# Altium integrated library Mastermind Devices.IntLib: 910 symbols (part 3 of 6) (continued)
## MCP23017SP
designator IC?, comment http://ww1.microchip.com/downloads/en/DeviceDoc/21952a.pdf   Source: http://ww1.microchip.com/downloads/en/DeviceDoc/21952a.pdf
footprint DIL28-3
pins: 1 GPB0, 2 GPB1, 3 GPB2, 4 GPB3, 5 GPB4, 6 GPB5, 7 GPB6, 8 GPB7, 9 VDD (power), 10 VSS (power), 12 SCL, 13 SDA, 15 A0, 16 A1, 17 A2, 18 !RESET, 19 INTB (out), 20 INTA (out), 21 GPA0, 22 GPA1, 23 GPA2, 24 GPA3, 25 GPA4, 26 GPA5, 27 GPA6, 28 GPA7

## MCP23017SP2
designator IC?, comment http://ww1.microchip.com/downloads/en/DeviceDoc/21952a.pdf   Source: http://ww1.microchip.com/downloads/en/DeviceDoc/21952a.pdf
footprint DIL28-3-ROUND
pins: 1 GPB0, 2 GPB1, 3 GPB2, 4 GPB3, 5 GPB4, 6 GPB5, 7 GPB6, 8 GPB7, 9 VDD (power), 10 VSS (power), 12 SCL, 13 SDA, 15 A0, 16 A1, 17 A2, 18 !RESET, 19 INTB (out), 20 INTA (out), 21 GPA0, 22 GPA1, 23 GPA2, 24 GPA3, 25 GPA4, 26 GPA5, 27 GPA6, 28 GPA7

## MCP23017SS
designator IC?, comment http://ww1.microchip.com/downloads/en/DeviceDoc/21952a.pdf   Source: http://ww1.microchip.com/downloads/en/DeviceDoc/21952a.pdf
footprint SSOP28
pins: 1 GPB0, 2 GPB1, 3 GPB2, 4 GPB3, 5 GPB4, 6 GPB5, 7 GPB6, 8 GPB7, 9 VDD (power), 10 VSS (power), 12 SCL, 13 SDA, 15 A0, 16 A1, 17 A2, 18 !RESET, 19 INTB (out), 20 INTA (out), 21 GPA0, 22 GPA1, 23 GPA2, 24 GPA3, 25 GPA4, 26 GPA5, 27 GPA6, 28 GPA7

## MCP73811/2
designator IC?, comment MCP73811 and MCP73812   Simple, Miniature Single-Cell, Fully Integrated Li-Ion / Li-Polymer Charge Management Controllers  SOT-23-5 package, no indicator LED but with adjustable current, small and very inexpensive  (value not drawn)
footprint SOT23-5L
pins: 1 CE, 2 VSS (power), 3 VBAT, 4 VDD (power), 5 PROG

## MCP73831/OT
designator IC?, comment MCP73831/2   Miniature Single-Cell, Fully Integrated Li-Ion, Li-Polymer Charge Management Controllers.    Nice and small simple lipoly charge controller, with adjustable current and status output (LED)    http://www.ladyada.net/library/pcb/eaglelibrary.html  (value not drawn)
footprint SOT23-5L
pins: 1 STAT (out), 2 VSS (power), 3 VBAT, 4 VDD (power), 5 PROG

## MCP73833-UN
designator IC?
footprint MSOP10
pins: 1 VDD1 (power), 2 VDD2 (power), 3 STAT1, 4 STAT2, 5 GND (power), 6 PROG, 7 /PG, 8 THERM, 9 VBAT1 (out), 10 VBAT2 (out)

## MCP73871
designator IC?
footprint QFN20
pins: 1 OUT1 (out), 2 VPCC, 3 SEL, 4 PROG2, 5 THERM, 6 /PG (out), 7 STAT2 (out), 8 STAT1/LBO (out), 9 /TE, 10 GND1 (power), 11 GND2 (power), 12 PROG3, 13 PROG1, 14 VBAT1 (out), 15 VBAT2 (out), 16 VBAT3 (out), 17 CE, 18 IN1, 19 IN2, 20 OUT2 (out)

## MCR100
designator Q?
Silicon Controlled Rectifier; Published: 8-Jun-2000; LatestRevisionDate: 17-Jul-2002; LatestRevisionNote: Re-released for DXP Platform.; PackageReference: TO-220-AB; Publisher: Altium Limited; Code_JEDEC: TO-220-AB
simulation model SCR (Spice Subcircuit)
footprint SOT23
pins: 1 K, 2 G, 3 A

## ME2187AN20BG
designator U?
-40℃~+85℃@(TA) 1 10A 2.7V~12V 4.5V~12.6V 550kHz 600uA Adjustable Boost Boost Built-in Yes DFN-20L(3.5x4.5) DC-DC Converters ROHS; Manufacturer: MICRONE(南京微盟); Contributor: LCSC; Supplier: LCSC; Supplier Part: C610274; Manufacturer Part: ME2187AN20BG; JLCPCB Part Class: Extended Part; spicePre: U; spiceSymbolName: ME2187AN20BG
footprint VQFN-20_L4.5-W3.5-P0.50-BL-EP_BQ24100RHLR; pin to pad 4>4+5+6+7 14>14+15+16
footprint Model Name (Footprint not found); pin to pad 4>4+5+6+7
pins: 1 VCC, 2 EN, 3 FSW, 4 SW, 8 BOOT, 9 VIN, 10 SS, 13 MODE, 14 VOUT, 17 FB, 18 COMP, 19 ILIM, 20 AGND, 21,11,12 PAD
text: 21

## ME3116
designator U?
Step-down type 1A 4.75V~40V SOT-23-6 DC-DC Converters ROHS
footprint SOT23-6
pins: 1 BS (power), 2 GND, 3 FB, 4 EN (power), 5 IN, 6 SW

## MIC2101YML-TR
designator U?
DC-DC Converters MLF-16; Manufacturer: MICROCHIP(美国微芯); Contributor: lcsc; Supplier: LCSC; Supplier Part: C621528; Manufacturer Part: MIC2101YML-TR; spicePre: U; spiceSymbolName: MIC2101YML-TR
footprint VQFN-16_L3.0-W3.0-P0.50-BL-EP1.7
pins: 1 VDD, 2 PVDD, 3 ILIM, 4 DL, 5 PGND, 6 FREQ, 7 DH, 8 SW, 9 GND hidden to GND, 10 BST, 11 GND hidden to GND, 12 AGND, 13 FB, 14 PG, 15 EN, 16 VIN, 17 GND hidden to GND

## MICRO-USB-LONG
designator J?
GateName_1: G$1; SymbolName_1: MICRO-USB-LONG; LibraryName: microusb; DeviceSetName: MICRO-USB-LONG; Package: MICRO_USB_LONG
footprint MICRO_USB_LONG
pins: 1 VCC (power), 2 GND (power)
text: USB

## MICROSD
designator ?, comment Micro-SD / Transflash card holder with SPI pinout   For the 3M # 2908-05WB-MG and/or 4UCON #19656 push-push type  (value not drawn)
GateName_1: G$1; DeviceSetName: MICROSD; SymbolName_1: TRANSFLASH; LibraryName: micro-sd; Package: C12075
footprint C12075
pins: 1 DAT2/RSV (io), 2 CD/DAT3/CS (io), 3 CMD/DI (io), 4 VDD (power), 5 CLK/SCLK (io), 6 GND (power), 7 DAT0/DO (io), 8 DAT1/RSV (io), CD (io), GND@1 SHIELD@1 (power), GND@2 SHIELD@2 (power), GND@3 SHIELD@3 (power), GND@4 SHIELD@4 (power)

## MICROSD_1
designator ?, comment Micro-SD / Transflash card holder with SPI pinout   For the 3M # 2908-05WB-MG and/or 4UCON #19656 push-push type  (value not drawn)
footprint MICROSD
pins: 1 DAT2, 2 CS, 3 DATA_IN, 4 VDD (oe), 5 SCLK, 6 VSS (oe), 7 DATA_OUT (out), 8 DAT1, CD1 CARD_DETECT, CD2 CARD_DETECT1, MT1 GND (oe), MT2 GND1 (oe)

## MIDIJACK
designator ?, comment DIN 5 jack also known as MIDI jackA modification of conn-hirshman:MAB5SH with two options for the grounding 'teeth'  (value not drawn)
footprint CP-2350
part A pins: PE MT
part B pins: PE@ MT
part C pins: 1, 2, 3, 4, 5
part D pins: PE1 MT
part E pins: PE2 MT

## MiniUSB-AB-SMT
designator J?, comment MicroUSB-B
MicroUSB-B-SMT; Part Number: USB-Micro-B-RA-SMD-PiP; Manufacturer: Allen Creations Corp.; Manufacturer Part Number: AJU55-BS2111-L; 2nd source part number: 609-4616-1-ND; Artikkelnr Noca: 55029020; Artikkelnr Simpro: N.A.; Datasheet: \\hizz\pro\app9717\Datasheet\connectores\Allen Creations Corp\AJU-211.pdf; Footprint Doc: USB-Micro-B-RA-SMD-PiP; LatestRevisionDate: 2016-04-21; Pin Count: 5; Publisher: Nordic Semiconductor; Published: 2014-10-07; Value: MicroUSB-B; Note: *; Supplier: Cabcon; Supplier part number: AJU55-BS2111-L; 2nd source Supplier: Digi-Key
footprint USB-Micro-B-RA-SMD-PiP
pins: 1 VBUS (power), 2 D-, 3 D+, 4 ID, 5 GND (power), 6 Shield (power)

## MMUN2211
designator Q?
NPN Bipolar Transistor; Published: 8-Jun-2000; LatestRevisionDate: 17-Jul-2002; LatestRevisionNote: Re-released for DXP Platform.; PackageReference: TO-226-AA; Publisher: Altium Limited; PackageDescription: TO, Flat Index; 3 In-Line, Axial Leads; Body Dia. 4.8mm; Leads 0.55 x 0.51 mm (max); Code_JEDEC: TO-226-AA
simulation model NPN
signal-integrity model NPN
footprint SOT23
pins: 1 B, 2 E, 3 C

## MNR34
designator RA?, comment 4K7
3216x4 Resistor Array; AEMS Code: 1300330
footprint MNR34
footprint MNR34T
pins: 1, 2, 3, 4, 5, 6, 7, 8

## MOC30*M
designator OK?, comment RANDOM-PHASE OPTOISOLATORS TRIAC DRIVER OUTPUT   Source: http://www.fairchildsemi.com MOC3020-M.pdf
footprint DIL06F
pins: 1 A "Anode", 2 K "Cathode", 4 C "Collector", 5 B "Base", 6 E "Emitter"

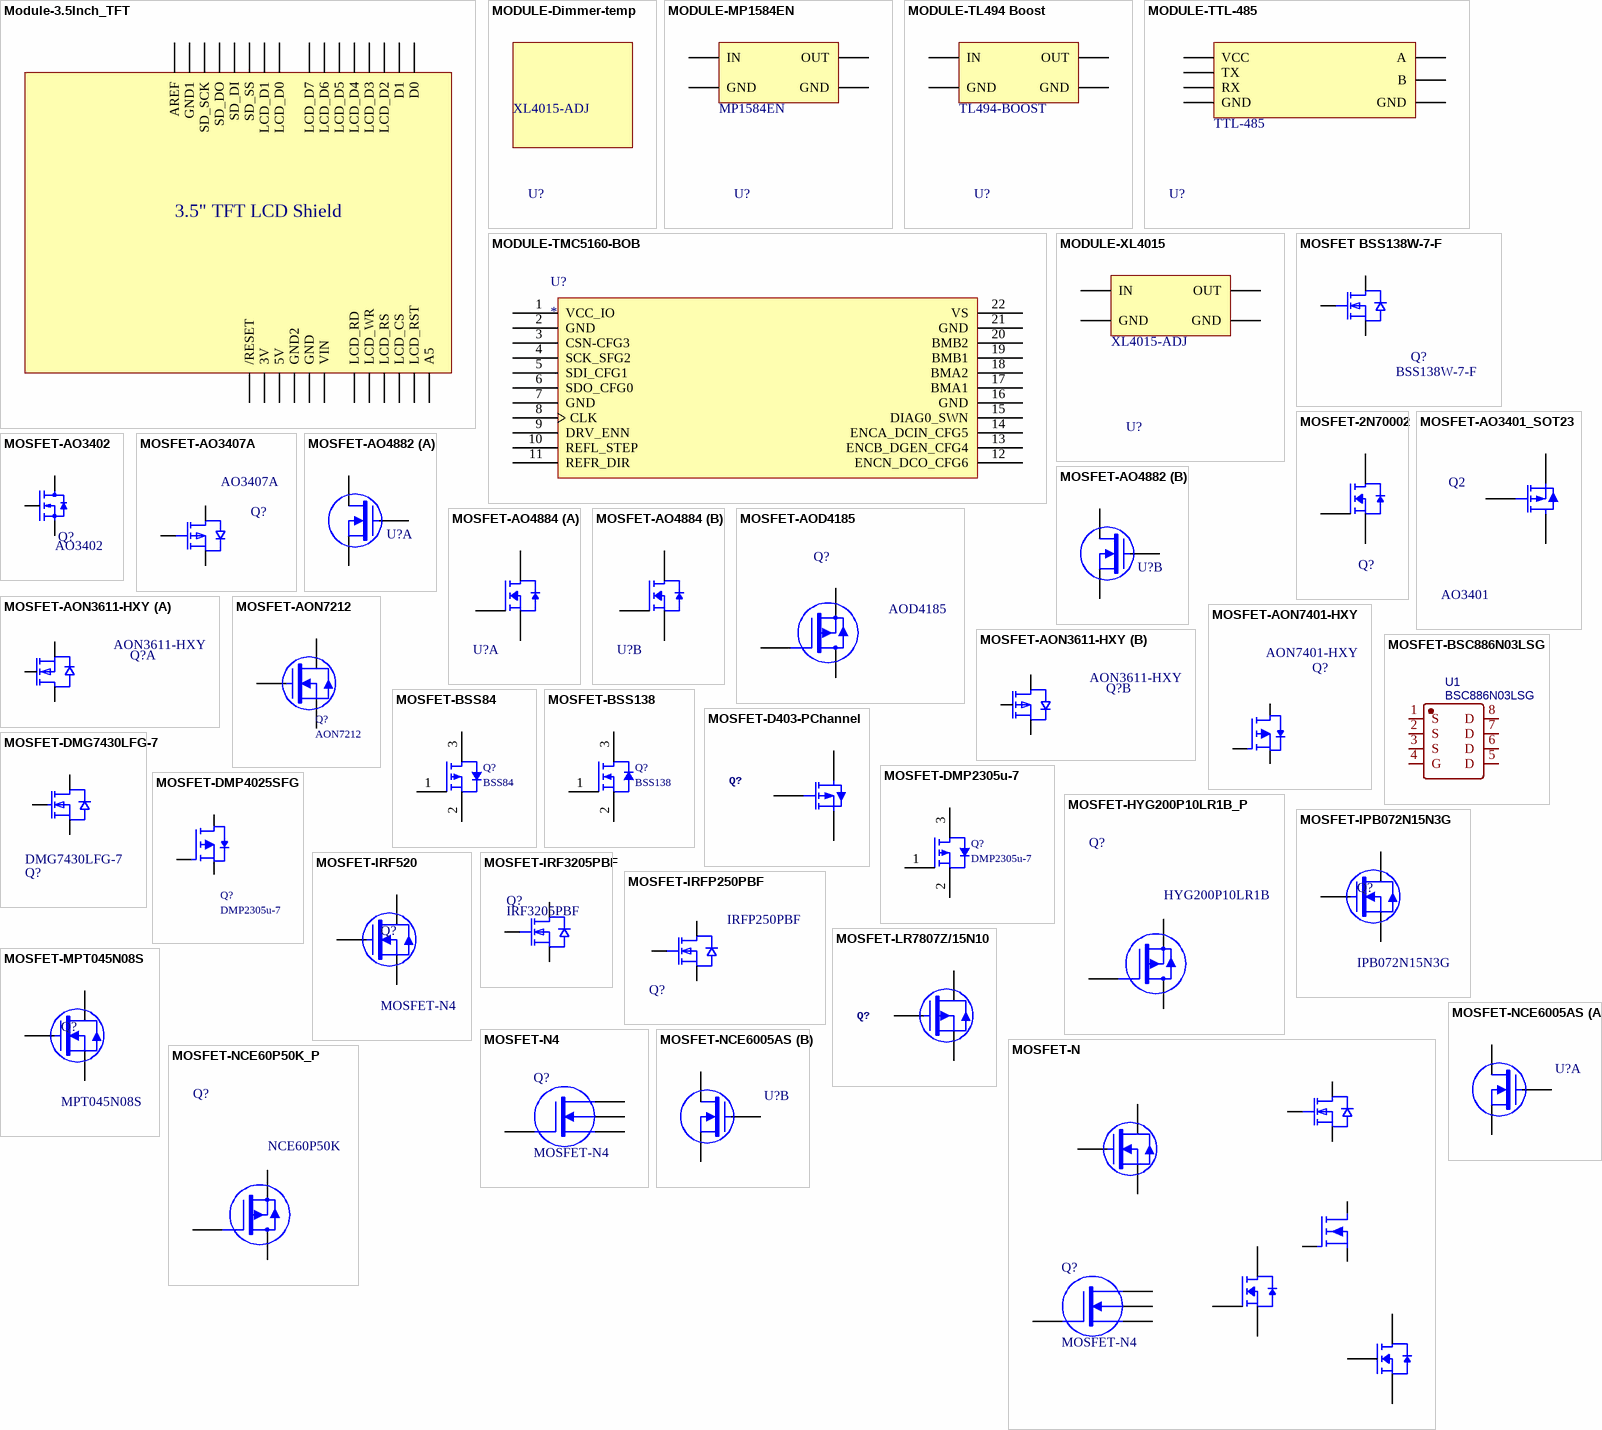
[diagram p19: symbols Module-3.5Inch_TFT to MOSFET-NCE6005AS]

## Module-3.5Inch_TFT
designator ?, comment Arduino Uno 3.5 TFT Sheild  (value not drawn)
footprint MODULE-3.5Inch_TFT
pins: 3V (power), 5V (power), A0 LCD_RD, A1 LCD_WR, A2 LCD_RS, A3 LCD_CS, A4 LCD_RST, A5, AREF, D0, D1, D2 LCD_D2, D3 LCD_D3, D4 LCD_D4, D5 LCD_D5, D6 LCD_D6, D7 LCD_D7, D8 LCD_D0, D9 LCD_D1, D10 SD_SS, D11 SD_DI, D12 SD_DO, D13 SD_SCK, GND GND1 (power), GND1 GND (power), GND2 (power), RESET /RESET, VIN (power)
text: 3.5" TFT LCD Shield

## MODULE-Dimmer-temp
designator U?
footprint MODULE-dimmmer-temp
text: XL4015-ADJ

## MODULE-MP1584EN
designator U?
footprint MODULE-MP1584EN
footprint MODULE-MP1584EN_1
pins: 1 IN, 2 GND, 3 GND, 4 OUT

## MODULE-TL494 Boost
designator U?
footprint MODULE-TL494
pins: 1 IN, 2 GND, 3 OUT, 4 GND
text: TL494-BOOST

## MODULE-TMC5160-BOB
designator U?
This board was developed for applications and installations where space is premium and projects are made as permanent set ups. Small, available in 3.3 V and 5 V versions, powered by ATmega328P.; MP: Arduino Pro Mini; MF: Arduino; Price: None; Availability: Not in stock; Package: None; Value: *; SnapEDA_Link: https://www.snapeda.com/parts/Arduino%20Pro%20Mini/Arduino/view-part/?ref=snap; Check_prices: https://www.snapeda.com/parts/Arduino%20Pro%20Mini/Arduino/view-part/?ref=eda
footprint Module_tmc5160_bob
pins: 1 VCC_IO (power), 2 GND (power), 3 CSN-CFG3, 4 SCK_SFG2, 5 SDI_CFG1, 6 SDO_CFG0, 7 GND, 8 CLK, 9 DRV_ENN, 10 REFL_STEP, 11 REFR_DIR, 12 ENCN_DCO_CFG6, 13 ENCB_DGEN_CFG4, 14 ENCA_DCIN_CFG5, 15 DIAG0_SWN, 16 GND, 17 BMA1, 18 BMA2, 19 BMB1, 20 BMB2, 21 GND (power), 22 VS (power)

## MODULE-TTL-485
designator U?
footprint Module-ttl-485
pins: 1 VCC, 2 TX, 3 RX, 4 GND, 5 GND, 6 B, 7 A
text: TTL-485

## MODULE-XL4015
designator U?
footprint MODULE-XL4015
pins: 1 IN, 2 GND, 3 OUT, 4 GND
text: XL4015-ADJ

## MOSFET BSS138W-7-F
designator Q?, comment BSS138W-7-F
SOT323 n mosfet; Manufacturer: DIODES(美台); Add into BOM: yes; Type: 1 N-Channel; Drain Source On Resistance (RDS(on)@Vgs,Id): 3.5Ω@10V,0.22A; Gate Threshold Voltage (Vgs(th)@Id): 1.5V@250uA; Input Capacitance (Ciss@Vds): 50pF@10V; Reverse Transfer Capacitance (Crss@Vds): 8pF@10V; Symbol: BSS138W-7-F; Device: BSS138W-7-F; LCSC Part Name: 1个N沟道 耐压:50V 电流:200mA; Supplier Part: C24553; Manufacturer Part: BSS138W-7-F; Supplier Footprint: SOT-323; JLCPCB Part Class: Extended Part; Datasheet: https://atta.szlcsc.com/upload/public/pdf/source/20140314/1457707015238.pdf; Supplier: LCSC; Convert to PCB: yes; Operating Temperature: -55℃~+150℃
footprint SC-70-3_L2.1-W1.3-P1.30-LS2.1-BR
pins: 1 G, 2 S, 3 D

## MOSFET-2N70002
designator Q?, comment 2N7002  (value not drawn)
N-Channel Mosfet 2N7002E - 60V 260mA SOT23
footprint SOT23
pins: 1 G "Gate", 2 S "Drain", 3 D "Source"

## MOSFET-AO3401_SOT23
designator Q2, comment AO3401
MOSFET-AO3401_SOT23
footprint SOT23
pins: 1 G, 2 S, 3 D

## MOSFET-AO3402
designator Q?, comment AO3402
N-Channle 30V 4A 52mΩ@10V 1.4W  SOT-23 MOSFETs ROHS; Manufacturer: Hottech(合科泰); Device: AO3402_C181092; Add into BOM: yes; Number: 1 N-Channel; Gate Threshold Voltage (Vgs(th)): 1.5V@250uA; Gate Charge(Qg): 12nC@10V; Input Capacitance(Ciss): 285pF; Reverse Transfer Capacitance (Crss@Vds): 25pF; Type: N-Channel; Output Capacitance(Coss): 45pF; Symbol: AO3402; LCSC Part Name: 1个N沟道 耐压:30V 电流:4A; Supplier Part: C181092; Manufacturer Part: AO3402; Supplier Footprint: SOT-23; JLCPCB Part Class: Extended Part; Datasheet: https://item.szlcsc.com/datasheet/AO3402/192489.html; Supplier: LCSC; Convert to PCB: yes; Drain to Source Voltage: 30V; Current - Continuous Drain(Id): 4A; RDS(on): 52mΩ@10V; Pd - Power Dissipation: 1.4W; Operating Temperature: -55℃~+150℃
footprint SOT-23-3_L2.9-W1.3-P1.90-LS2.4-BR
3D model SOT-23-3P_L2.9-W1.3-H1.0-LS2.4-P0.95
footprint SOT23
pins: 1 G, 2 S, 3 D

## MOSFET-AO3407A
designator Q?, comment AO3407A
Manufacturer: AOS; Device: AO3407A_C15155; Add into BOM: yes; Type: 1 Piece P-Channel; Drain Source On Resistance (RDS(on)@Vgs,Id): 48mΩ@10V,4.3A; Gate Threshold Voltage (Vgs(th)@Id): 2.5V@250uA; Total Gate Charge (Qg@Vgs): 16nC@10V; Input Capacitance (Ciss@Vds): 830pF@15V; Reverse Transfer Capacitance (Crss@Vds): 92pF@15V; Symbol: AO3407A; LCSC Part Name: 1个P沟道 耐压:30V 电流:4.3A; Supplier Part: C15155; Manufacturer Part: AO3407A; Supplier Footprint: SOT-23-3L; JLCPCB Part Class: Extended Part; Datasheet: https://atta.szlcsc.com/upload/public/pdf/source/20130715/1457706623734.pdf; Supplier: LCSC; Convert to PCB: yes; Operating Temperature: -55℃~+150℃
footprint SOT23
pins: 1 G, 2 S, 3 D

## MOSFET-AO4882
designator U?, comment AO4882  (value not drawn)
2 N-Channel 40V 8A 27mΩ@4.5V,4A 2W 2.4V@250uA  SOIC-8 MOSFETs ROHS
footprint SOIC-8E (SOIC, 8-Leads, Body 4.90x3.90mm, Pitch 1.27mm, IPC Medium Density); pin to pad 6>5+6
part A pins: 3 S1, 4 G1, 6 D1
part B pins: 1 S2, 2 G2, 8 D2

## MOSFET-AO4884
designator U?, comment AO4884  (value not drawn)
Dual N-Channel 40V 10A  27mΩ  SOP8; Manufacturer: HXY MOSFET(华轩阳电子); Manufacturer Part: AO4884-HXY; Contributor: lcsc; Supplier: LCSC; Supplier Part: C5148656; JLCPCB Part Class: Extended Part; spicePre: U; spiceSymbolName: AO4884_C5148656
footprint SOIC-8E (SOIC, 8-Leads, Body 4.90x3.90mm, Pitch 1.27mm, IPC Medium Density); pin to pad 5>5+6 7>7+8
part A pins: 1 S "Drain", 2 G "Gate", 7 D "Source"
part B pins: 3 S "Drain", 4 G "Gate", 5 D "Source"

## MOSFET-AOD4185
designator Q?, comment AOD4185
P-Channel MOSFET,  40V 40A; Published: 24-Mar-1999; LatestRevisionDate: 29-May-2009; LatestRevisionNote: IPC-7351 Footprint Added.; PackageVersion: Sep-2000; PackageReference: SOT-343; Publisher: Altium Limited; PackageDescription: 4-Pin SOT-343 Package 1.3 mm Pitch, 2.1 mm Lead Span
footprint TO252
pins: 1 G, 2 S, 3 D

## MOSFET-AON3611-HXY
designator Q?, comment AON3611-HXY
P&N 30V 10.8W 30mΩ@10V,14A 2.5V 1 N-Channel + 1 P-Channel DFN-8L(3x3) MOSFETs ROHS; Manufacturer: HXY MOSFET(华轩阳电子); Symbol: AON3611_C5148676; Add into BOM: yes; Continuous Drain Current (Id): ；; Gate Threshold Voltage (Vgs(th)@Id): 2.5V@250uA; Input Capacitance (Ciss@Vds): 930pF@20V；416pF@20V; Device: AON3611-HXY; LCSC Part Name: 1个N沟道+1个P沟道 耐压:30V 电流:20A; Supplier Part: C5148676; Manufacturer Part: AON3611-HXY; Supplier Footprint: DFN-8L(3x3); JLCPCB Part Class: Extended Part; Datasheet: https://atta.szlcsc.com/upload/public/pdf/source/20220920/2590343197E12B9657A592BDD68BC526.pdf; Supplier: LCSC; Convert to PCB: yes; Type: 1 N-Channel + 1 P-Channel; Drain Source On Resistance (RDS(on)@Vgs,Id): 30mΩ@10V,14A; Power Dissipation (Pd): 10.8W; Operating Temperature: -55℃~+150℃
footprint DFN-8_L3.2-W3.2-P0.65-LS3.4-BL-EP; pin to pad 5>5+6+10 7>7+8+9
3D model DFN-8_L3.2-W3.2-H0.8-P0.65-LS3.4-BL-EP
part A pins: 1 S, 2 G, 7 D
part B pins: 3 S, 4 G, 5 D

## MOSFET-AON7212
designator Q?, comment AON7212
N Channel Mosfet 30V 40A dfn-8
footprint POWERDI3333-8_L3.3-W3.3-P0.65-BL
pins: 1 G, 2 S, 3 D

## MOSFET-AON7401-HXY
designator Q?, comment AON7401-HXY
P-Channel 1.5V 1.75nF@15V 15mΩ@10V,10A 180pF@15V 24nC@10V 30V 3W 50A DFN-8L(5x6) MOSFETs ROHS; Manufacturer: HXY MOSFET(华轩阳电子); Symbol: AON7401_C5148678; Add into BOM: yes; Type: 1 Piece P-Channel; Gate Threshold Voltage (Vgs(th)@Id): 1.5V@250uA; Device: AON7401-HXY; LCSC Part Name: 1个P沟道 耐压:30V 电流:50A; Supplier Part: C5148678; Manufacturer Part: AON7401-HXY; Supplier Footprint: DFN-8L(5x6); JLCPCB Part Class: Extended Part; Datasheet: https://atta.szlcsc.com/upload/public/pdf/source/20220920/DB5CBAFD8C08A907271DD8B13E6E92A3.pdf; Supplier: LCSC; Convert to PCB: yes; Drain Source On Resistance (RDS(on)@Vgs,Id): 15mΩ@10V,10A; Total Gate Charge (Qg@Vgs): 24nC@10V; Input Capacitance (Ciss@Vds): 1.75nF@15V; Reverse Transfer Capacitance (Crss@Vds): 180pF@15V; Operating Temperature: -55℃~+150℃
footprint PQFN-8_L5.8-W4.9-P1.27-LS6.0-BL (Footprint not found); pin to pad 1>1+2+3 5>5+6+7+8+9
3D model PQFN-8_L5.8-W4.9-H1.0-P1.27-LS6.0-BL
pins: 1 S, 4 G, 5 D

## MOSFET-BSC886N03LSG
designator U1, comment BSC886N03LSG
Manufacturer: Infineon(英飞凌); Contributor: lcsc; Supplier: LCSC; Supplier Part: C3275891; Manufacturer Part: BSC886N03LSG; spicePre: U; spiceSymbolName: BSC886N03LSG
footprint PG-TDSON-8_L5.0-W6.0-P1.27-BL-EP
pins: 1 S, 2 S, 3 S, 4 G, 5 D, 6 D, 7 D, 8 D

## MOSFET-BSS84
designator Q?, comment BSS84
P Channel Mosfet, Sot23
footprint SOT23
pins: 1 "Gate", 2 "Source", 3 "Drain"

## MOSFET-BSS138
designator Q?, comment BSS138
N Channel Mosfet
footprint SOT23
pins: 1 "Gate", 2 "Source", 3 "Drain"

## MOSFET-D403-PChannel
designator Q?
footprint TO252
pins: 1 G, 2 S, 3 D

## MOSFET-DMG7430LFG-7
designator Q?, comment DMG7430LFG-7
Manufacturer: DIODES(美台); Add into BOM: yes; Number: 1 N-Channel; Drain to Source Voltage: 30V; Current - Continuous Drain(Id): 10.5A; RDS(on): 15mΩ@4.5V; Pd - Power Dissipation: 1.5W; Gate Threshold Voltage (Vgs(th)): 2.5V@250uA; Gate Charge(Qg): 26.7nC@10V; Input Capacitance(Ciss): 1.281nF@15V; Reverse Transfer Capacitance (Crss@Vds): 125pF@15V; Symbol: DMG7430LFG-7; Device: DMG7430LFG-7; LCSC Part Name: 1个N沟道 耐压:30V 电流:10.5A; Supplier Part: C212330; Manufacturer Part: DMG7430LFG-7; Supplier Footprint: PowerDI3333-8; JLCPCB Part Class: Extended Part; Datasheet: https://item.szlcsc.com/datasheet/DMG7430LFG-7/213198.html; Supplier: LCSC; Convert to PCB: yes; Operating Temperature: -55℃~+150℃
3D model POWERDI3333-8_L3.3-W3.3-H0.8-P0.65-BL
footprint POWERDI3333-8_L3.3-W3.3-P0.65-BL_1; pin to pad 1,2,3>1+2+3
pins: 1,2,3 S, 4 G, 5 D

## MOSFET-DMP2305u-7
designator Q?, comment DMP2305u-7
P Channel Mosfet
footprint SOT23
pins: 1 "Gate", 2 "Source", 3 "Drain"

## MOSFET-DMP4025SFG
designator Q?, comment DMP2305u-7
P Channel Mosfet
footprint POWERDI3333-8_L3.3-W3.3-P0.65-BL
pins: 1 G, 2 S, 3 D

## MOSFET-HYG200P10LR1B_P
designator Q?, comment HYG200P10LR1B
P-Channel MOSFET,  100V 80A Externally Terminated Substrate; Published: 24-Mar-1999; LatestRevisionDate: 29-May-2009; LatestRevisionNote: IPC-7351 Footprint Added.; PackageVersion: Sep-2000; PackageReference: SOT-343; Publisher: Altium Limited; PackageDescription: 4-Pin SOT-343 Package 1.3 mm Pitch, 2.1 mm Lead Span
footprint TO-263-2
pins: 1 G, 2 D, 3 S

## MOSFET-IPB072N15N3G
designator Q?, comment IPB072N15N3G
N-Channel MOSFET,  100V 80A  7.2mΩ; Published: 24-Mar-1999; LatestRevisionDate: 29-May-2009; LatestRevisionNote: IPC-7351 Footprint Added.; PackageVersion: Sep-2000; PackageReference: SOT-343; Publisher: Altium Limited; PackageDescription: 4-Pin SOT-343 Package 1.3 mm Pitch, 2.1 mm Lead Span
footprint TO-263-2
pins: 1 G, 2 D, 3 S

## MOSFET-IRF520
designator Q?, comment MOSFET-N4
N-Channel MOSFET; Published: 24-Mar-1999; LatestRevisionDate: 29-May-2009; LatestRevisionNote: IPC-7351 Footprint Added.; PackageVersion: Sep-2000; PackageReference: SOT-343; Publisher: Altium Limited; PackageDescription: 4-Pin SOT-343 Package 1.3 mm Pitch, 2.1 mm Lead Span
footprint TO220
pins: 1 G, 2 D, 3 S

## MOSFET-IRF3205PBF
designator Q?, comment IRF3205PBF
Manufacturer: Infineon(英飞凌); Add into BOM: yes; Type: 1 N-Channel; Drain Source On Resistance (RDS(on)@Vgs,Id): 8mΩ@10V,62A; Gate Threshold Voltage (Vgs(th)@Id): 4V@250uA; Total Gate Charge (Qg@Vgs): 146nC; Input Capacitance (Ciss@Vds): 3247pF; Reverse Transfer Capacitance (Crss@Vds): 211pF; Symbol: IRF3205PBF; Device: IRF3205PBF; LCSC Part Name: 1个N沟道 耐压:55V 电流:110A; Supplier Part: C2561; Manufacturer Part: IRF3205PBF; Supplier Footprint: TO-220AB; JLCPCB Part Class: Extended Part; Datasheet: https://atta.szlcsc.com/upload/public/pdf/source/20201126/C2561_C063ADD03C5ACFC796E423BE08ECDD89.pdf; Supplier: LCSC; Convert to PCB: yes; Operating Temperature: -55℃~+175℃
footprint TO-220-3_L10.0-W4.5-P2.54-L
3D model TO-220-3_L10.0-W4.5-P2.54-L
pins: 1 G, 2 D, 3 S

## MOSFET-IRFP250PBF
designator Q?, comment IRFP250PBF
N-Channel; Manufacturer: VISHAY(威世); Add into BOM: yes; Drain Source On Resistance (RDS(on)@Vgs,Id): 85mΩ@10V,18A; Gate Threshold Voltage (Vgs(th)@Id): 4V@250uA; Total Gate Charge (Qg@Vgs): 140nC@10V; Input Capacitance (Ciss@Vds): 2.8nF@25V; Symbol: IRFP250PBF; Device: IRFP250PBF; Supplier: LCSC; Manufacturer Part: IRFP250PBF; Supplier Part: C11749; JLCPCB Part Class: Extended Part; LCSC Part Name: N沟道 耐压:200V 电流:30A; Supplier Footprint: TO-247AC-3; Datasheet: https://atta.szlcsc.com/upload/public/pdf/source/20130302/1457706596399.pdf; Convert to PCB: yes; Operating Temperature: -55℃~+150℃@(Tj); Name: IRFP250PBF
footprint TO-247AC-3_L15.8-W5.0-P5.46-L
pins: 1 G, 2 D, 3 S

## MOSFET-LR7807Z/15N10
designator Q?
P-
footprint TO252
footprint TO254P-3N
pins: 1 G, 2 D, 3 S

## MOSFET-MPT045N08S
designator Q?, comment MPT045N08S
N-Channel MOSFET,  85V 138A  4.4mΩ; Published: 24-Mar-1999; LatestRevisionDate: 29-May-2009; LatestRevisionNote: IPC-7351 Footprint Added.; PackageVersion: Sep-2000; PackageReference: SOT-343; Publisher: Altium Limited; PackageDescription: 4-Pin SOT-343 Package 1.3 mm Pitch, 2.1 mm Lead Span
footprint TO-263-2
pins: 1 G, 2 D, 3 S

## MOSFET-N
designator Q?, comment MOSFET-N4
N-Channel MOSFET; Published: 24-Mar-1999; LatestRevisionDate: 29-May-2009; LatestRevisionNote: IPC-7351 Footprint Added.; PackageVersion: Sep-2000; PackageReference: SOT-343; Publisher: Altium Limited; PackageDescription: 4-Pin SOT-343 Package 1.3 mm Pitch, 2.1 mm Lead Span
pins: 1 G, 1 G "Gate", 1 G, 1 G, 1 G "Gate", 1 G, 2 D, 2 S "Drain", 2 S, 2 D, 2 S "Drain", 2 D, 3 U, 3 D "Source", 3 D, 3 D "Source", 3 S, 4 S, 4 S

## MOSFET-N4
designator Q?
N-Channel MOSFET, Externally Terminated Substrate; Published: 24-Mar-1999; LatestRevisionDate: 29-May-2009; LatestRevisionNote: IPC-7351 Footprint Added.; PackageVersion: Sep-2000; PackageReference: SOT-343; Publisher: Altium Limited; PackageDescription: 4-Pin SOT-343 Package 1.3 mm Pitch, 2.1 mm Lead Span
footprint SOT-343_N (SOT343, 4-Leads, Body 2x1.3 mm, Pitch 1.3mm, Lead Span 2.1mm, IPC Medium Density)
footprint SOT-343_L (SOT343, 4-Leads, Body 2x1.3 mm, Pitch 1.3mm, Lead Span 2.1mm, IPC High Density)
footprint SOT-343_M (SOT343, 4-Leads, Body 2x1.3 mm, Pitch 1.3mm, Lead Span 2.1mm, IPC Low Density)
simulation model NMOS (MOSFET-N)
pins: 1 G, 2 D, 3 U, 4 S

## MOSFET-NCE60P50K_P
designator Q?, comment NCE60P50K
P-Channel MOSFET,  60V 50A; Published: 24-Mar-1999; LatestRevisionDate: 29-May-2009; LatestRevisionNote: IPC-7351 Footprint Added.; PackageVersion: Sep-2000; PackageReference: SOT-343; Publisher: Altium Limited; PackageDescription: 4-Pin SOT-343 Package 1.3 mm Pitch, 2.1 mm Lead Span
footprint TO252
pins: 1 G, 2 S, 3 D
